# Altium integrated library RL2.IntLib: 663 symbols (part 3 of 4) (continued)
## ATSAME70Q19A-CN (continued)
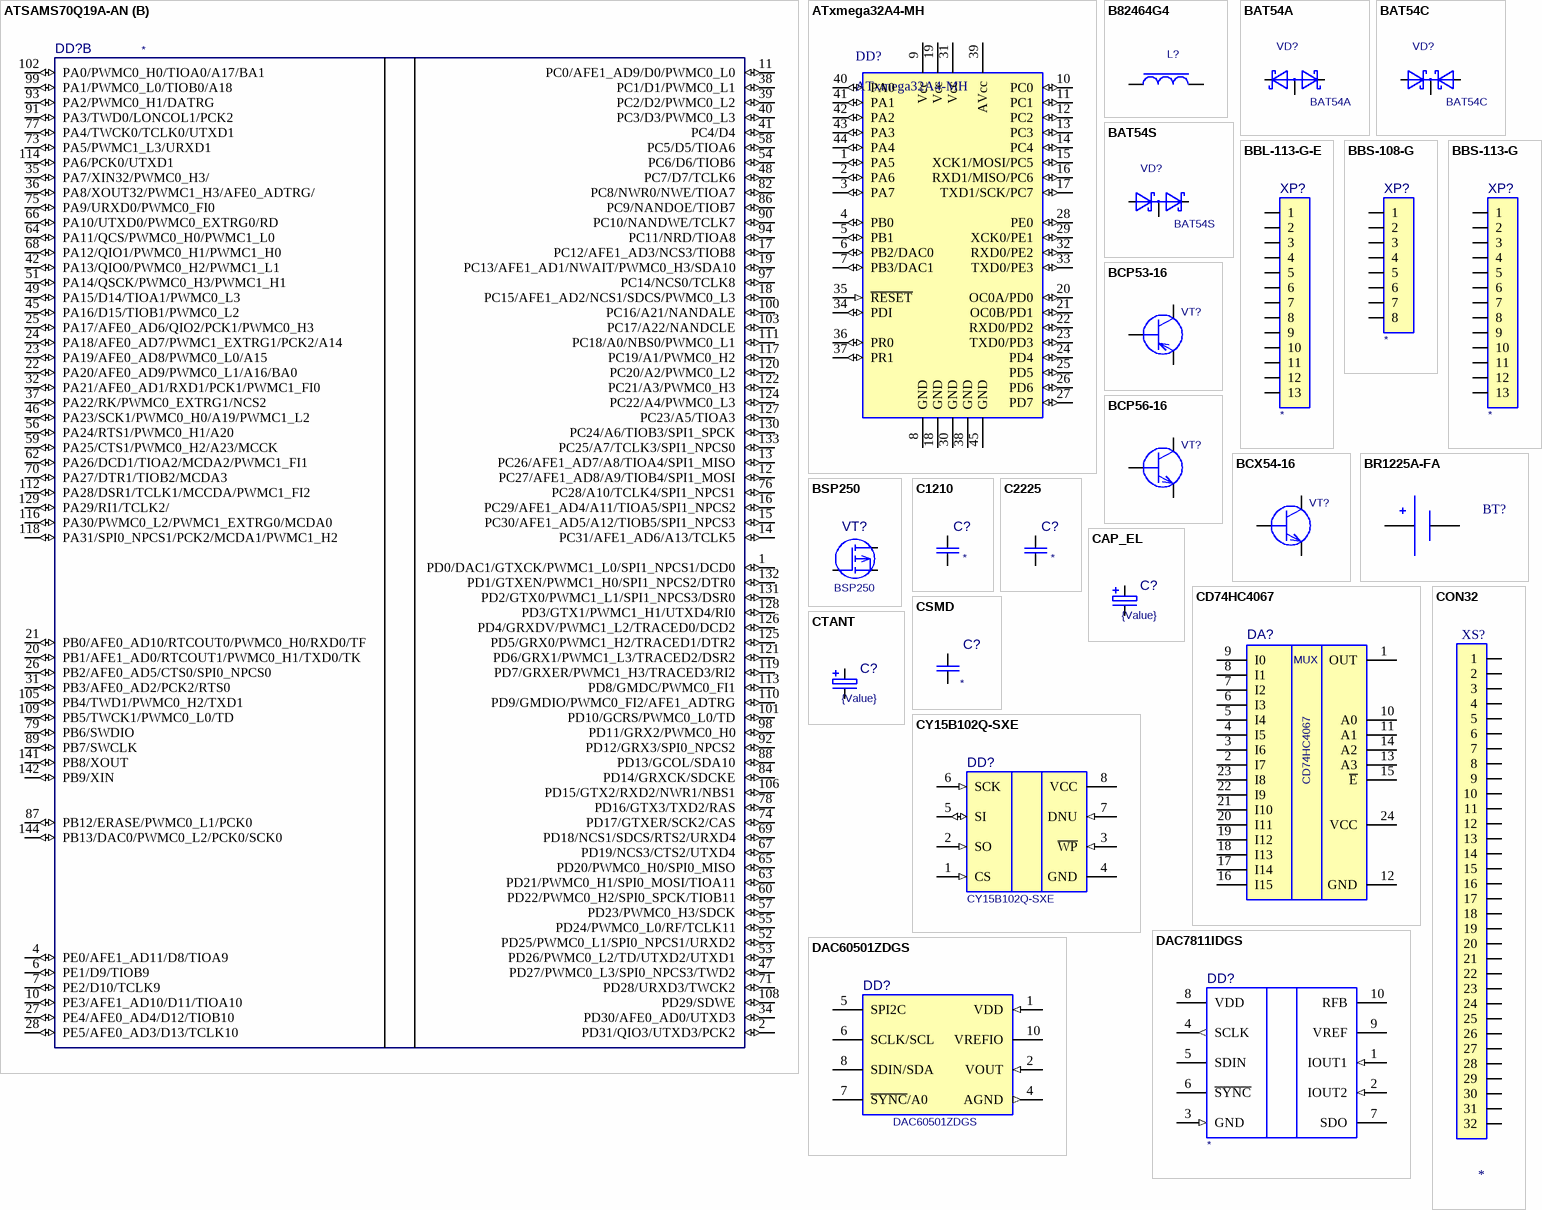
[diagram p26: symbols ATSAMS70Q19A-AN to DAC60501ZDGS]

## ATSAMS70Q19A-AN
designator DD?
footprint LQFP144
part A pins: 3 VDDOUT (power), 5 VDDIN (power), 8 VREFN (power), 9 VREFP (power), 29 VDDCORE (power), 30 VDDIO (power), 33 VDDCORE (power), 43 VDDIO (power), 44 GND (power), 50 VDDCORE (power), 61 GND (power), 72 VDDIO (power), 80 VDDIO (power), 81 VDDCORE (power), 83 NRST (in), 85 TEST (in), 95 GND (power), 96 VDDIO (power), 104 JTAGSEL (in), 107 VDDCORE (power), 115 GND (power), 123 VDDPLL (power), 134 VDDUTMII (power), 135 GND (power), 136 HSDM (io), 137 HSDP (io), 138 GND (power), 139 VDDUTMIC (power), 140 VBG (in), 143 VDDPLLUSB (power)
part B pins: 1 PD0/DAC1/GTXCK/PWMC1_L0/SPI1_NPCS1/DCD0 (io), 2 PD31/QIO3/UTXD3/PCK2 (io), 4 PE0/AFE1_AD11/D8/TIOA9 (io), 6 PE1/D9/TIOB9 (io), 7 PE2/D10/TCLK9 (io), 10 PE3/AFE1_AD10/D11/TIOA10 (io), 11 PC0/AFE1_AD9/D0/PWMC0_L0 (io), 12 PC27/AFE1_AD8/A9/TIOB4/SPI1_MOSI (io), 13 PC26/AFE1_AD7/A8/TIOA4/SPI1_MISO (io), 14 PC31/AFE1_AD6/A13/TCLK5 (io), 15 PC30/AFE1_AD5/A12/TIOB5/SPI1_NPCS3 (io), 16 PC29/AFE1_AD4/A11/TIOA5/SPI1_NPCS2 (io), 17 PC12/AFE1_AD3/NCS3/TIOB8 (io), 18 PC15/AFE1_AD2/NCS1/SDCS/PWMC0_L3 (io), 19 PC13/AFE1_AD1/NWAIT/PWMC0_H3/SDA10 (io), 20 PB1/AFE1_AD0/RTCOUT1/PWMC0_H1/TXD0/TK (io), 21 PB0/AFE0_AD10/RTCOUT0/PWMC0_H0/RXD0/TF (io), 22 PA20/AFE0_AD9/PWMC0_L1/A16/BA0 (io), 23 PA19/AFE0_AD8/PWMC0_L0/A15 (io), 24 PA18/AFE0_AD7/PWMC1_EXTRG1/PCK2/A14 (io), 25 PA17/AFE0_AD6/QIO2/PCK1/PWMC0_H3 (io), 26 PB2/AFE0_AD5/CTS0/SPI0_NPCS0 (io), 27 PE4/AFE0_AD4/D12/TIOB10 (io), 28 PE5/AFE0_AD3/D13/TCLK10 (io), 31 PB3/AFE0_AD2/PCK2/RTS0 (io), 32 PA21/AFE0_AD1/RXD1/PCK1/PWMC1_FI0 (io), 34 PD30/AFE0_AD0/UTXD3 (io), 35 PA7/XIN32/PWMC0_H3/ (io), 36 PA8/XOUT32/PWMC1_H3/AFE0_ADTRG/ (io), 37 PA22/RK/PWMC0_EXTRG1/NCS2 (io), 38 PC1/D1/PWMC0_L1 (io), 39 PC2/D2/PWMC0_L2 (io), 40 PC3/D3/PWMC0_L3 (io), 41 PC4/D4 (io), 42 PA13/QIO0/PWMC0_H2/PWMC1_L1 (io), 45 PA16/D15/TIOB1/PWMC0_L2 (io), 46 PA23/SCK1/PWMC0_H0/A19/PWMC1_L2 (io), 47 PD27/PWMC0_L3/SPI0_NPCS3/TWD2 (io), 48 PC7/D7/TCLK6 (io), 49 PA15/D14/TIOA1/PWMC0_L3 (io), 51 PA14/QSCK/PWMC0_H3/PWMC1_H1 (io), 52 PD25/PWMC0_L1/SPI0_NPCS1/URXD2 (io), 53 PD26/PWMC0_L2/TD/UTXD2/UTXD1 (io), 54 PC6/D6/TIOB6 (io), 55 PD24/PWMC0_L0/RF/TCLK11 (io), 56 PA24/RTS1/PWMC0_H1/A20 (io), 57 PD23/PWMC0_H3/SDCK (io), 58 PC5/D5/TIOA6 (io), 59 PA25/CTS1/PWMC0_H2/A23/MCCK (io), 60 PD22/PWMC0_H2/SPI0_SPCK/TIOB11 (io), 62 PA26/DCD1/TIOA2/MCDA2/PWMC1_FI1 (io), 63 PD21/PWMC0_H1/SPI0_MOSI/TIOA11 (io), 64 PA11/QCS/PWMC0_H0/PWMC1_L0 (io), 65 PD20/PWMC0_H0/SPI0_MISO (io), 66 PA10/UTXD0/PWMC0_EXTRG0/RD (io), 67 PD19/NCS3/CTS2/UTXD4 (io), 68 PA12/QIO1/PWMC0_H1/PWMC1_H0 (io), 69 PD18/NCS1/SDCS/RTS2/URXD4 (io), 70 PA27/DTR1/TIOB2/MCDA3 (io), 71 PD28/URXD3/TWCK2 (io), 73 PA5/PWMC1_L3/URXD1 (io), 74 PD17/GTXER/SCK2/CAS (io), 75 PA9/URXD0/PWMC0_FI0 (io), 76 PC28/A10/TCLK4/SPI1_NPCS1 (io), 77 PA4/TWCK0/TCLK0/UTXD1 (io), 78 PD16/GTX3/TXD2/RAS (io), 79 PB6/SWDIO (io), 82 PC8/NWR0/NWE/TIOA7 (io), 84 PD14/GRXCK/SDCKE (io), 86 PC9/NANDOE/TIOB7 (io), 87 PB12/ERASE/PWMC0_L1/PCK0 (io), 88 PD13/GCOL/SDA10 (io), 89 PB7/SWCLK (io), 90 PC10/NANDWE/TCLK7 (io), 91 PA3/TWD0/LONCOL1/PCK2 (io), 92 PD12/GRX3/SPI0_NPCS2 (io), 93 PA2/PWMC0_H1/DATRG (io), 94 PC11/NRD/TIOA8 (io), 97 PC14/NCS0/TCLK8 (io), 98 PD11/GRX2/PWMC0_H0 (io), 99 PA1/PWMC0_L0/TIOB0/A18 (io), 100 PC16/A21/NANDALE (io), 101 PD10/GCRS/PWMC0_L0/TD (io), 102 PA0/PWMC0_H0/TIOA0/A17/BA1 (io), 103 PC17/A22/NANDCLE (io), 105 PB4/TWD1/PWMC0_H2/TXD1 (io), 106 PD15/GTX2/RXD2/NWR1/NBS1 (io), 108 PD29/SDWE (io), 109 PB5/TWCK1/PWMC0_L0/TD (io), 110 PD9/GMDIO/PWMC0_FI2/AFE1_ADTRG (io), 111 PC18/A0/NBS0/PWMC0_L1 (io), 112 PA28/DSR1/TCLK1/MCCDA/PWMC1_FI2 (io), 113 PD8/GMDC/PWMC0_FI1 (io), 114 PA6/PCK0/UTXD1 (io), 116 PA30/PWMC0_L2/PWMC1_EXTRG0/MCDA0 (io), 117 PC19/A1/PWMC0_H2 (io), 118 PA31/SPI0_NPCS1/PCK2/MCDA1/PWMC1_H2 (io), 119 PD7/GRXER/PWMC1_H3/TRACED3/RI2 (io), 120 PC20/A2/PWMC0_L2 (io), 121 PD6/GRX1/PWMC1_L3/TRACED2/DSR2 (io), 122 PC21/A3/PWMC0_H3 (io), 124 PC22/A4/PWMC0_L3 (io), 125 PD5/GRX0/PWMC1_H2/TRACED1/DTR2 (io), 126 PD4/GRXDV/PWMC1_L2/TRACED0/DCD2 (io), 127 PC23/A5/TIOA3 (io), 128 PD3/GTX1/PWMC1_H1/UTXD4/RI0 (io), 129 PA29/RI1/TCLK2/ (io), 130 PC24/A6/TIOB3/SPI1_SPCK (io), 131 PD2/GTX0/PWMC1_L1/SPI1_NPCS3/DSR0 (io), 132 PD1/GTXEN/PWMC1_H0/SPI1_NPCS2/DTR0 (io), 133 PC25/A7/TCLK3/SPI1_NPCS0 (io), 141 PB8/XOUT (io), 142 PB9/XIN (io), 144 PB13/DAC0/PWMC0_L2/PCK0/SCK0 (io)

## ATxmega32A4-MH
designator DD?
XMEGA processor
footprint VQFN44M1
pins: 1 PA5 (io), 2 PA6 (io), 3 PA7 (io), 4 PB0 (io), 5 PB1 (io), 6 PB2/DAC0 (io), 7 PB3/DAC1 (io), 8 GND (power), 9 Vcc (power), 10 PC0 (io), 11 PC1 (io), 12 PC2 (io), 13 PC3 (io), 14 PC4 (io), 15 XCK1/MOSI/PC5 (io), 16 RXD1/MISO/PC6 (io), 17 TXD1/SCK/PC7 (io), 18 GND (power), 19 Vcc (power), 20 OC0A/PD0 (io), 21 OC0B/PD1 (io), 22 RXD0/PD2 (io), 23 TXD0/PD3 (io), 24 PD4 (io), 25 PD5 (io), 26 PD6 (io), 27 PD7 (io), 28 PE0 (io), 29 XCK0/PE1 (io), 30 GND (power), 31 Vcc (power), 32 RXD0/PE2 (io), 33 TXD0/PE3 (io), 34 PDI (io), 35 ~{RESET} (in), 36 PR0 (io), 37 PR1 (io), 38 GND (power), 39 AVcc (power), 40 PA0 (io), 41 PA1 (io), 42 PA2 (io), 43 PA3 (io), 44 PA4 (io), 45 GND (power)

## B82464G4
designator L?  (value not drawn)
SMT power inductors; Value: *
footprint B82464G4 (SM Inductor; 2 Leads; Size 10x10 mm)
pins: 1, 2

## BAT54A
designator VD?
30V, 200mA, Schottky Diodes; Value: *
footprint SOT-23
pins: 1 A, 2 K, 3 C

## BAT54C
designator VD?
30V, 200mA, Schottky Diodes; Value: *
footprint SOT-23
pins: 1 A, 2 K, 3 C

## BAT54S
designator VD?
30V, 200mA, Schottky Diodes; Value: *
footprint SOT-23
pins: 1 A, 2 K, 3 C

## BBL-113-G-E
designator XP?
Part Field 1: *; Part Field 2: *
footprint BBL-113-G-E
pins: 1, 2, 3, 4, 5, 6, 7, 8, 9, 10, 11, 12, 13

## BBS-108-G
designator XP?
Part Field 1: *; Part Field 2: *
footprint BBS-108-G-A
pins: 1, 2, 3, 4, 5, 6, 7, 8

## BBS-113-G
designator XP?
Part Field 1: *; Part Field 2: *
footprint BBS-113-G-B
footprint BBS-113-G-A
footprint BBS-113-G-C
pins: 1, 2, 3, 4, 5, 6, 7, 8, 9, 10, 11, 12, 13

## BCP53-16
designator VT?  (value not drawn)
80V, 1A PNP medium power transistors; Value: *
footprint SOT-223 PWR
pins: 1 B, 2 C, 3 E

## BCP56-16
designator VT?  (value not drawn)
80V, 1A NPN medium power transistors; Value: *
footprint SOT-223 PWR
pins: 1 B, 2 C, 3 E

## BCX54-16
designator VT?  (value not drawn)
45V, 1A NPN medium power transistor; Value: *
footprint SOT-89
pins: 1 B, 2 C, 3 E

## BR1225A-FA
designator BT?, comment Батарея BR1225A-FA  (value not drawn)
Part Field 1: *
pins: 1 + (power), 2 - (power)

## BSP250
designator VT?
Value: *
footprint SOT-223 PWR
pins: 1, 2, 3

## C1210
designator C?
C1210; Part Field 1: 1210; Value: *
footprint C1210
pins: 1, 2

## C2225
designator C?
C2225; Part Field 1: C2225; Value: *
footprint C2225
pins: 1, 2

## CAP_EL
designator C?  value {Value}  (hidden comment: *)
CAP_EL; Part Field 1: *; Part Field 2: *
footprint CAP_EL_16_32_HR
footprint CAP_EL_10_25_HR
footprint CAP_EL_10_20_HR
footprint CAP_EL_10_10_SMD
pins: 1, 2

## CD74HC4067
designator DA?
16-Channel Analog Multiplexer/Demultiplexer; Part Field 1: *; Part Field 2: *
footprint SSOP-24 (MO-150)
pins: 1 OUT, 2 I7, 3 I6, 4 I5, 5 I4, 6 I3, 7 I2, 8 I1, 9 I0, 10 A0, 11 A1, 12 GND, 13 A3, 14 A2, 15 ~{E}, 16 I15, 17 I14, 18 I13, 19 I12, 20 I11, 21 I10, 22 I9, 23 I8, 24 VCC
text: MUX

## CON32
designator XS?
Part Field 1: *; Part Field 2: *
pins: 1, 2, 3, 4, 5, 6, 7, 8, 9, 10, 11, 12, 13, 14, 15, 16, 17, 18, 19, 20, 21, 22, 23, 24, 25, 26, 27, 28, 29, 30, 31, 32

## CSMD
designator C?
C0603; Voltage: *; Part Field 1: *; Part Field 2: *; Value: *
footprint C0603
signal-integrity model capasitor (Model Description)
footprint C0805
footprint C0805L
footprint C0603L
pins: 1, 2

## CTANT
designator C?  value {Value}  (hidden comment: *)
CTANT; Part Field 1: *; Part Field 2: *
footprint C_A_POL_CTANT_A(Primary)
footprint C_D_POL
footprint C_B_POL
footprint C_C_POL
footprint C_R_POL
pins: N, P

## CY15B102Q-SXE
designator DD?
footprint SOIC8 EIAJ
signal-integrity model Model Name (Model Description)
pins: 1 CS (in), 2 SO (in), 3 ~{WP} (in), 4 GND (power), 5 SI (io), 6 SCK (in), 7 DNU (in), 8 VCC (power)

## DAC7811IDGS
designator DD?
footprint MSOP10 (MO-187-BA)
pins: 1 IOUT1 (in), 2 IOUT2 (in), 3 GND (in), 4 SCLK (out), 5 SDIN (power), 6 ~{SYNC} (power), 7 SDO (power), 8 VDD (power), 9 VREF (power), 10 RFB (power)

## DAC60501ZDGS
designator DD?
DACx0501 16-Bit, 14-Bit, and 12-Bit, 1-LSB INL, Voltage-Output DACs With Precision Internal Reference / • 16-bit performance: 1-LSB INL and DNL (max) / • Low glitch energy: 4 nV–s / • Wide power supply: 2.7 V to 5.5 V / • Buffered output range: 5 V, 2.5 V, or 1.25 V / • Very-low power: 1 mA at 5.5 V / • Integrated 5-ppm/˚C (max), 2.5-V precision / reference / • Pin-selectable serial interface: / – 3-wire, SPI compatible up to 50-MHz / – 2-wire, I2C compatible / • Power-on-reset: Zero scale or midscale / • 1.62-V VIH with VDD = 5.5 V / • Temperature range: –40˚C to +125˚C
footprint MSOP10 (MO-187-BA)
pins: 1 VDD (in), 2 VOUT (in), 4 AGND (out), 5 SPI2C (power), 6 SCLK/SCL (power), 7 ~{SYNC}/A0 (power), 8 SDIN/SDA (power), 10 VREFIO (power)

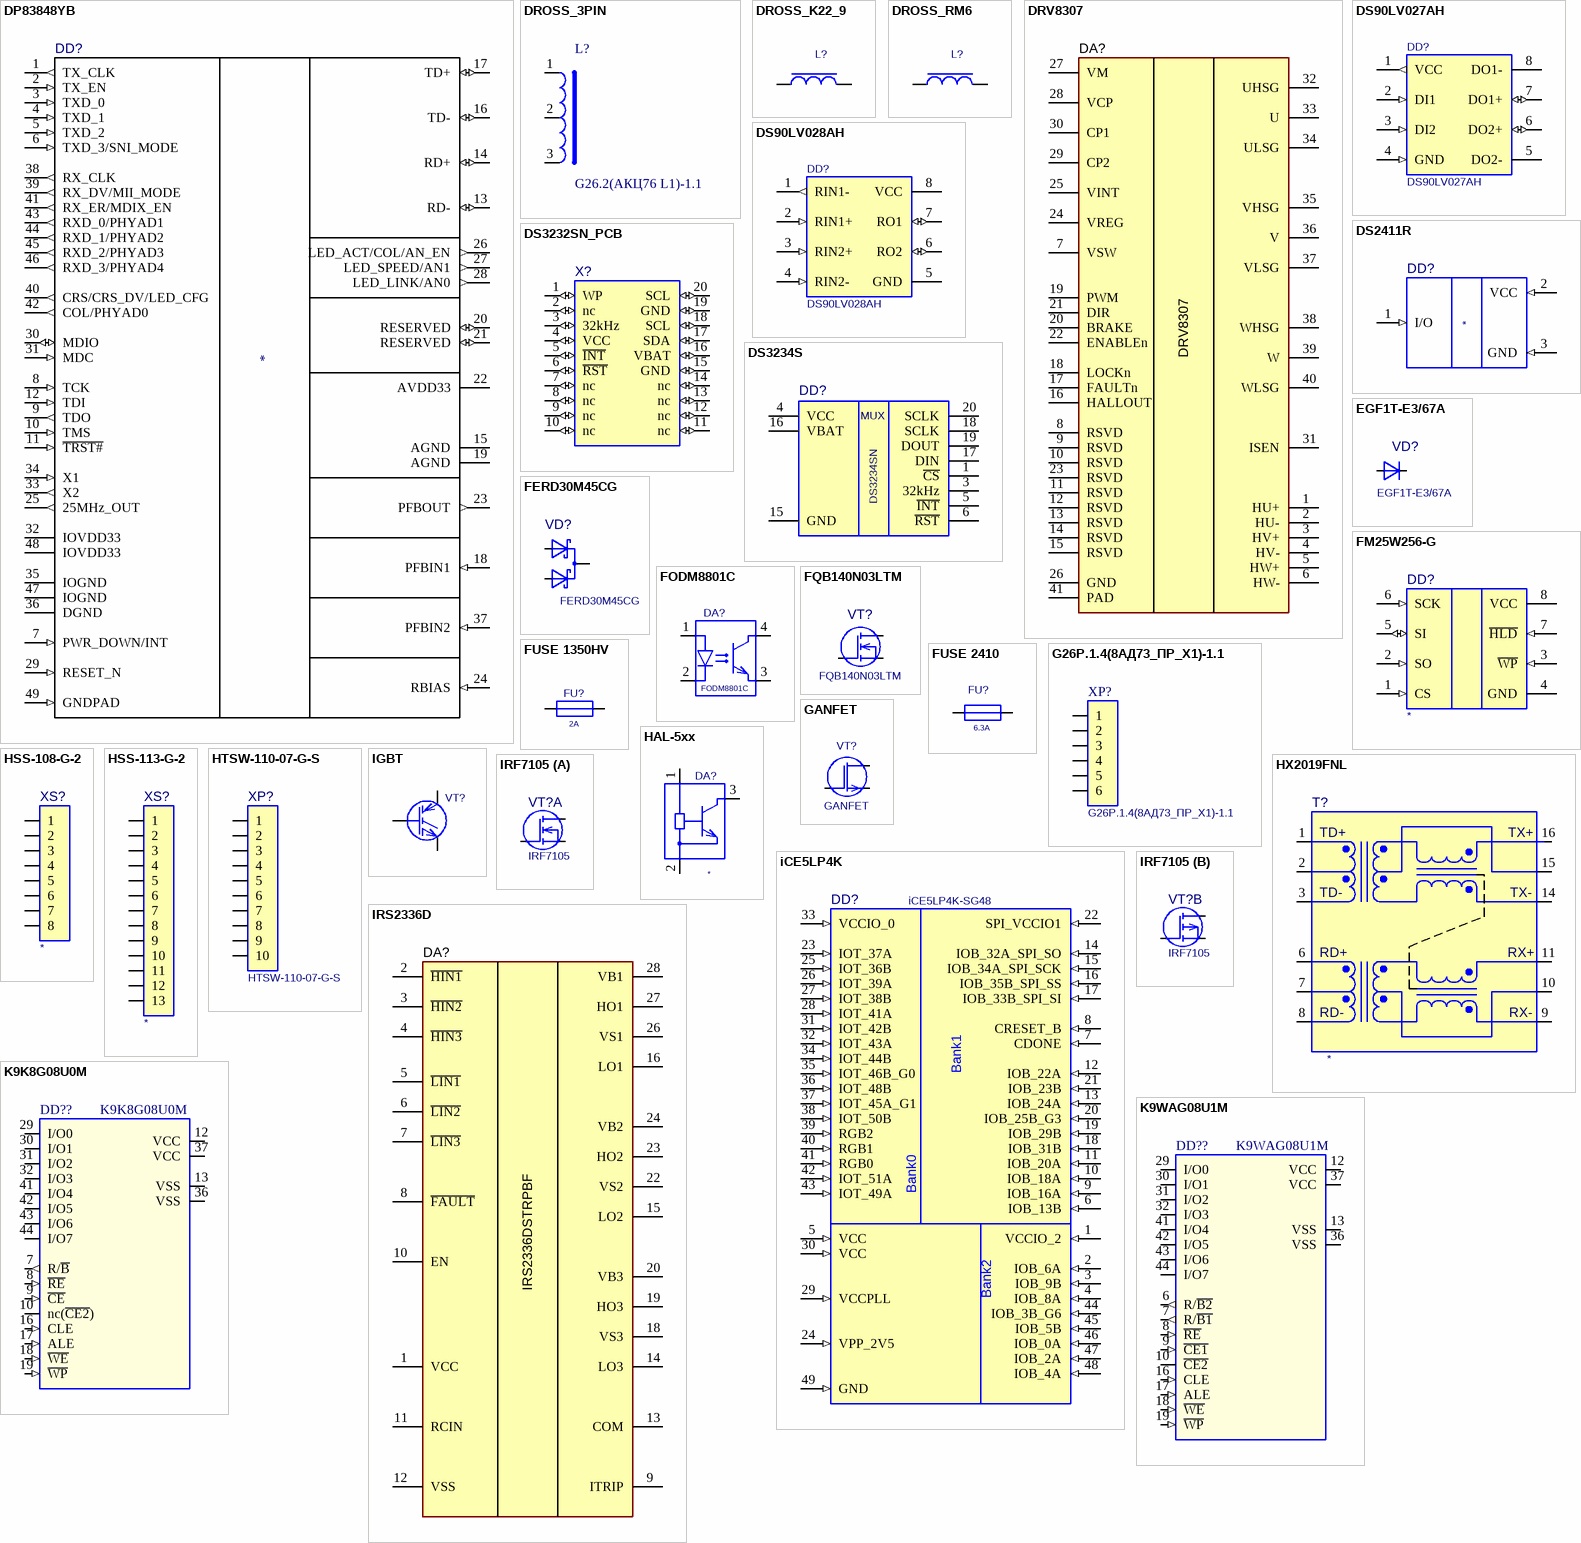
[diagram p27: symbols DP83848YB to K9WAG08U1M]

## DP83848YB
designator DD?
footprint LQFP48_VXH48A
signal-integrity model DP83848YB (DP83848YB IBIS)
pins: 1 TX_CLK (out), 2 TX_EN (in), 3 TXD_0 (in), 4 TXD_1 (in), 5 TXD_2 (in), 6 TXD_3/SNI_MODE (in), 7 PWR_DOWN/INT (in), 8 TCK (in), 9 TDO (out), 10 TMS (in), 11 ~{TRST#} (in), 12 TDI (in), 13 RD- (io), 14 RD+ (io), 15 AGND (power), 16 TD- (io), 17 TD+ (io), 18 PFBIN1 (in), 19 AGND (power), 20 RESERVED (io), 21 RESERVED (io), 22 AVDD33 (power), 23 PFBOUT (out), 24 RBIAS (in), 25 25MHz_OUT (out), 26 LED_ACT/COL/AN_EN (out), 27 LED_SPEED/AN1 (out), 28 LED_LINK/AN0 (out), 29 RESET_N (in), 30 MDIO (io), 31 MDC (in), 32 IOVDD33 (power), 33 X2 (out), 34 X1 (in), 35 IOGND (power), 36 DGND (power), 37 PFBIN2 (in), 38 RX_CLK (out), 39 RX_DV/MII_MODE (out), 40 CRS/CRS_DV/LED_CFG (out), 41 RX_ER/MDIX_EN (out), 42 COL/PHYAD0 (out), 43 RXD_0/PHYAD1 (out), 44 RXD_1/PHYAD2 (out), 45 RXD_2/PHYAD3 (out), 46 RXD_3/PHYAD4 (out), 47 IOGND (power), 48 IOVDD33 (power), 49 GNDPAD (in)

## DROSS_3PIN
designator L?, comment G26.2(АКЦ76 L1)-1.1
Part Field 1: *; Part Field 2: *
footprint K24-3 (Дроссель)
pins: 1, 2, 3

## DROSS_K22_9
designator L?  (value not drawn)
B82464G4; Value: *
footprint K22-9-2 (Дроссель)
pins: 1, 2

## DROSS_RM6
designator L?  (value not drawn)
B82464G4; Value: *
footprint RM6-6_E-045-1 (RM Cores B65807)
pins: 2, 6

## DRV8307
designator DA?
Manufacturer: Texas Instruments; MFG Part Number: DRV8307RHAT; Digikey Part#: N/A; Value: N/A
footprint VQFN40 (QFN, 40-Leads, Body 6x6mm, Pitch 0.5mm, Thermal Pad 2.9x2.9mm, TI Recommended)
pins: 1 HU+, 2 HU-, 3 HV+, 4 HV-, 5 HW+, 6 HW-, 7 VSW, 8 RSVD, 9 RSVD, 10 RSVD, 11 RSVD, 12 RSVD, 13 RSVD, 14 RSVD, 15 RSVD, 16 HALLOUT, 17 FAULTn, 18 LOCKn, 19 PWM, 20 BRAKE, 21 DIR, 22 ENABLEn, 23 RSVD, 24 VREG, 25 VINT, 26 GND, 27 VM, 28 VCP, 29 CP2, 30 CP1, 31 ISEN, 32 UHSG, 33 U, 34 ULSG, 35 VHSG, 36 V, 37 VLSG, 38 WHSG, 39 W, 40 WLSG, 41 PAD

## DS90LV027AH
designator DD?
DS90LV027AH high temperature LVDS dual differential driver; Value: *
footprint SOIC8 JEDEC
pins: 1 VCC (out), 2 DI1 (in), 3 DI2 (in), 4 GND (in), 5 DO2- (power), 6 DO2+ (io), 7 DO1+ (io), 8 DO1- (power)

## DS90LV028AH
designator DD?
DS90LV028AH high temperature3-V LVDS dual differentialline receiver; Value: *
footprint SOIC8 JEDEC
pins: 1 RIN1- (out), 2 RIN1+ (in), 3 RIN2+ (in), 4 RIN2- (in), 5 GND (power), 6 RO2 (io), 7 RO1 (io), 8 VCC (power)

## DS2411R
designator DD?
footprint SOT-23
pins: 1 I/O (in), 2 VCC (in), 3 GND (in)

## DS3232SN_PCB
designator X?
footprint DS3232SN_PCB
pins: 1 WP (io), 2 nc (io), 3 32kHz (io), 4 VCC (io), 5 ~{INT} (io), 6 ~{RST} (io), 7 nc (io), 8 nc (io), 9 nc (io), 10 nc (io), 11 nc (io), 12 nc (io), 13 nc (io), 14 nc (io), 15 GND (io), 16 VBAT (io), 17 SDA (io), 18 SCL (io), 19 GND (io), 20 SCL (io)

## DS3234S
designator DD?, comment DS3234SN
Part Field 1: *; Part Field 2: *
footprint SOIC-20 (JEDEC MS-013-AC)
pins: 1 ~{CS}, 3 32kHz, 4 VCC, 5 ~{INT}, 6 ~{RST}, 15 GND, 16 VBAT, 17 DIN, 18 SCLK, 19 DOUT, 20 SCLK
text: MUX

## EGF1T-E3/67A
designator VD?
Value: *
footprint DO-214BA GF1
pins: 1, 2

## FERD30M45CG
designator VD?
Value: *
footprint D2PAK TO-263-2
pins: 1 A1, 2 A2, 3 K

## FM25W256-G
designator DD?
footprint SOIC8 JEDEC
signal-integrity model Model Name (Model Description)
pins: 1 CS (in), 2 SO (in), 3 ~{WP} (in), 4 GND (power), 5 SI (io), 6 SCK (in), 7 ~{HLD} (in), 8 VCC (power)

## FODM8801C
designator DA?
Value: *
footprint Mini-Flat-4
pins: 1, 2, 3, 4

## FQB140N03LTM
designator VT?
Value: *
footprint D2PAK TO-263-2
pins: 1, 2, 3

## FUSE 1350HV
designator FU?, comment value 2A  (hidden comment: TR-1350HV2-R)
High voltage fast-acting brick fuse
footprint FUSE 1350HV
pins: 1, 2

## FUSE 2410
designator FU?, comment value 6.3A  (hidden comment: 0679L6300-05)
MF-MSMF160
footprint FUSE2410
pins: 1, 2

## G26P.1.4(8АД73_ПР_Х1)-1.1
designator XP?
Part Field 1: *; Part Field 2: *
footprint G26P.1.4(8АД73_ПР_Х1)-1.1
pins: 1, 2, 3, 4, 5, 6

## GANFET
designator VT?
Gallium Nitride (GaN) FET; OriginalName: 2N4124; ComponentField6: Published 8-Jun-2000, Modified 11-July-2000: SIM Model Added.; Value: *
footprint TO-247H-GAN-BOTTOM
pins: 1 G, 2 S, 3 D

## HAL-5xx
designator DA?
Hall Effect Sensor; Value: *
footprint HAL-5xx (TO-92UA)
pins: 1, 2, 3

## HSS-108-G-2
designator XS?
HSS-108-G-2; Part Field 1: *; Part Field 2: *
footprint HSS-108-G-2 h4.4
pins: 1, 2, 3, 4, 5, 6, 7, 8

## HSS-113-G-2
designator XS?
Part Field 1: *; Part Field 2: *
footprint HSS-113-G-2 h4.4
footprint HSS-113-G-2 h2.54
pins: 1, 2, 3, 4, 5, 6, 7, 8, 9, 10, 11, 12, 13

## HTSW-110-07-G-S
designator XP?
Part Field 1: *; Part Field 2: *
footprint HTSW-110-07-G-S
pins: 1, 2, 3, 4, 5, 6, 7, 8, 9, 10

## HX2019FNL
designator T?
footprint HX2019FNL
pins: 1 TD+, 2, 3, 6, 7, 8, 9 5, 10 5, 11 5, 14, 15 EARTH, 16 EARTH
text: TX+; TD-; TX-; RD+; RX+; RD-; RX-

## iCE5LP4K
designator DD?, comment iCE5LP4K-SG48
footprint QFN48_5.8 (QFN, 64-Leads, Body 9x9mm, Pitch 0.5mm, Thermal Pad 7.3x7.3mm, IPC Low Density)
pins: 1 VCCIO_2 (in), 2 IOB_6A (in), 3 IOB_9B (in), 4 IOB_8A (in), 5 VCC (in), 6 IOB_13B (in), 7 CDONE (in), 8 CRESET_B (in), 9 IOB_16A (in), 10 IOB_18A (in), 11 IOB_20A (in), 12 IOB_22A (in), 13 IOB_24A (in), 14 IOB_32A_SPI_SO (in), 15 IOB_34A_SPI_SCK (in), 16 IOB_35B_SPI_SS (in), 17 IOB_33B_SPI_SI (in), 18 IOB_31B (in), 19 IOB_29B (in), 20 IOB_25B_G3 (in), 21 IOB_23B (in), 22 SPI_VCCIO1 (in), 23 IOT_37A (in), 24 VPP_2V5 (in), 25 IOT_36B (in), 26 IOT_39A (in), 27 IOT_38B (in), 28 IOT_41A (in), 29 VCCPLL (in), 30 VCC (in), 31 IOT_42B (in), 32 IOT_43A (in), 33 VCCIO_0 (in), 34 IOT_44B (in), 35 IOT_46B_G0 (in), 36 IOT_48B (in), 37 IOT_45A_G1 (in), 38 IOT_50B (in), 39 RGB2 (in), 40 RGB1 (in), 41 RGB0 (in), 42 IOT_51A (in), 43 IOT_49A (in), 44 IOB_3B_G6 (in), 45 IOB_5B (in), 46 IOB_0A (in), 47 IOB_2A (in), 48 IOB_4A (in), 49 GND (in)
text: Bank1; Bank0; Bank2

## IGBT
designator VT?  (value not drawn)
STGD5NB120SZT4; Value: *
footprint D-PAK (TO-252)
footprint D2PAK TO-263-2
pins: 1 G, 2 E, 3 C

## IRF7105
designator VT?
footprint SOIC8 DBL FET
part A pins: 1, 2, 6
part B pins: 3, 4, 5

## IRS2336D
designator DA?, comment IRS2336DSTRPBF
Manufacturer: International Rectifier; Digikey Part#: N/A; MFG Part Number: IRS2336DSTRPBF; Value: N/A
footprint SOIC-28-300
pins: 1 VCC, 2 ~{HIN1}, 3 ~{HIN2}, 4 ~{HIN3}, 5 ~{LIN1}, 6 ~{LIN2}, 7 ~{LIN3}, 8 ~{FAULT}, 9 ITRIP, 10 EN, 11 RCIN, 12 VSS, 13 COM, 14 LO3, 15 LO2, 16 LO1, 18 VS3, 19 HO3, 20 VB3, 22 VS2, 23 HO2, 24 VB2, 26 VS1, 27 HO1, 28 VB1

## K9K8G08U0M
designator DD??
Part Field 1: *; Part Field 2: *
footprint TSSO12X20-G48/P.5
pins: 1 nc (power) hidden to GND, 2 nc (power) hidden to GND, 3 nc (power) hidden to GND, 4 nc (power) hidden to GND, 5 nc (power) hidden to GND, 6 nc (power) hidden to GND, 7 R/~{B} (out), 8 ~{RE} (in), 9 ~{CE} (in), 10 nc(~{CE2}), 11 nc (power) hidden to GND, 12 VCC (power), 13 VSS (power), 14 nc (power) hidden to GND, 15 nc (power) hidden to GND, 16 CLE (in), 17 ALE (in), 18 ~{WE} (in), 19 ~{WP} (in), 20 nc (power) hidden to GND, 21 nc (power) hidden to GND, 22 nc (power) hidden to GND, 23 nc (power) hidden to GND, 24 nc (power) hidden to GND, 25 nc (power) hidden to GND, 26 nc (power) hidden to GND, 27 nc (power) hidden to GND, 28 nc (power) hidden to GND, 29 I/O0 (io), 30 I/O1 (io), 31 I/O2 (io), 32 I/O3 (io), 33 nc (power) hidden to GND, 34 nc (power) hidden to GND, 35 nc (power) hidden to GND, 36 VSS (power), 37 VCC (power), 38 nc (power) hidden to GND, 39 nc (power) hidden to GND, 40 nc (power) hidden to GND, 41 I/O4 (io), 42 I/O5 (io), 43 I/O6 (io), 44 I/O7 (io), 45 nc (power) hidden to GND, 46 nc (power) hidden to GND, 47 nc (power) hidden to GND, 48 nc (power) hidden to GND

## K9WAG08U1M
designator DD??
Part Field 1: *; Part Field 2: *
footprint TSSO12X20-G48/P.5
pins: 1 nc (power) hidden to GND, 2 nc (power) hidden to GND, 3 nc (power) hidden to GND, 4 nc (power) hidden to GND, 5 nc (power) hidden to GND, 6 R/~{B2} (out), 7 R/~{B1} (out), 8 ~{RE} (in), 9 ~{CE1} (in), 10 ~{CE2}, 11 nc (power) hidden to GND, 12 VCC (power), 13 VSS (power), 14 nc (power) hidden to GND, 15 nc (power) hidden to GND, 16 CLE (in), 17 ALE (in), 18 ~{WE} (in), 19 ~{WP} (in), 20 nc (power) hidden to GND, 21 nc (power) hidden to GND, 22 nc (power) hidden to GND, 23 nc (power) hidden to GND, 24 nc (power) hidden to GND, 25 nc (power) hidden to GND, 26 nc (power) hidden to GND, 27 nc (power) hidden to GND, 28 nc (power) hidden to GND, 29 I/O0 (io), 30 I/O1 (io), 31 I/O2 (io), 32 I/O3 (io), 33 nc (power) hidden to GND, 34 nc (power) hidden to GND, 35 nc (power) hidden to GND, 36 VSS (power), 37 VCC (power), 38 nc (power) hidden to GND, 39 nc (power) hidden to GND, 40 nc (power) hidden to GND, 41 I/O4 (io), 42 I/O5 (io), 43 I/O6 (io), 44 I/O7 (io), 45 nc (power) hidden to GND, 46 nc (power) hidden to GND, 47 nc (power) hidden to GND, 48 nc (power) hidden to GND

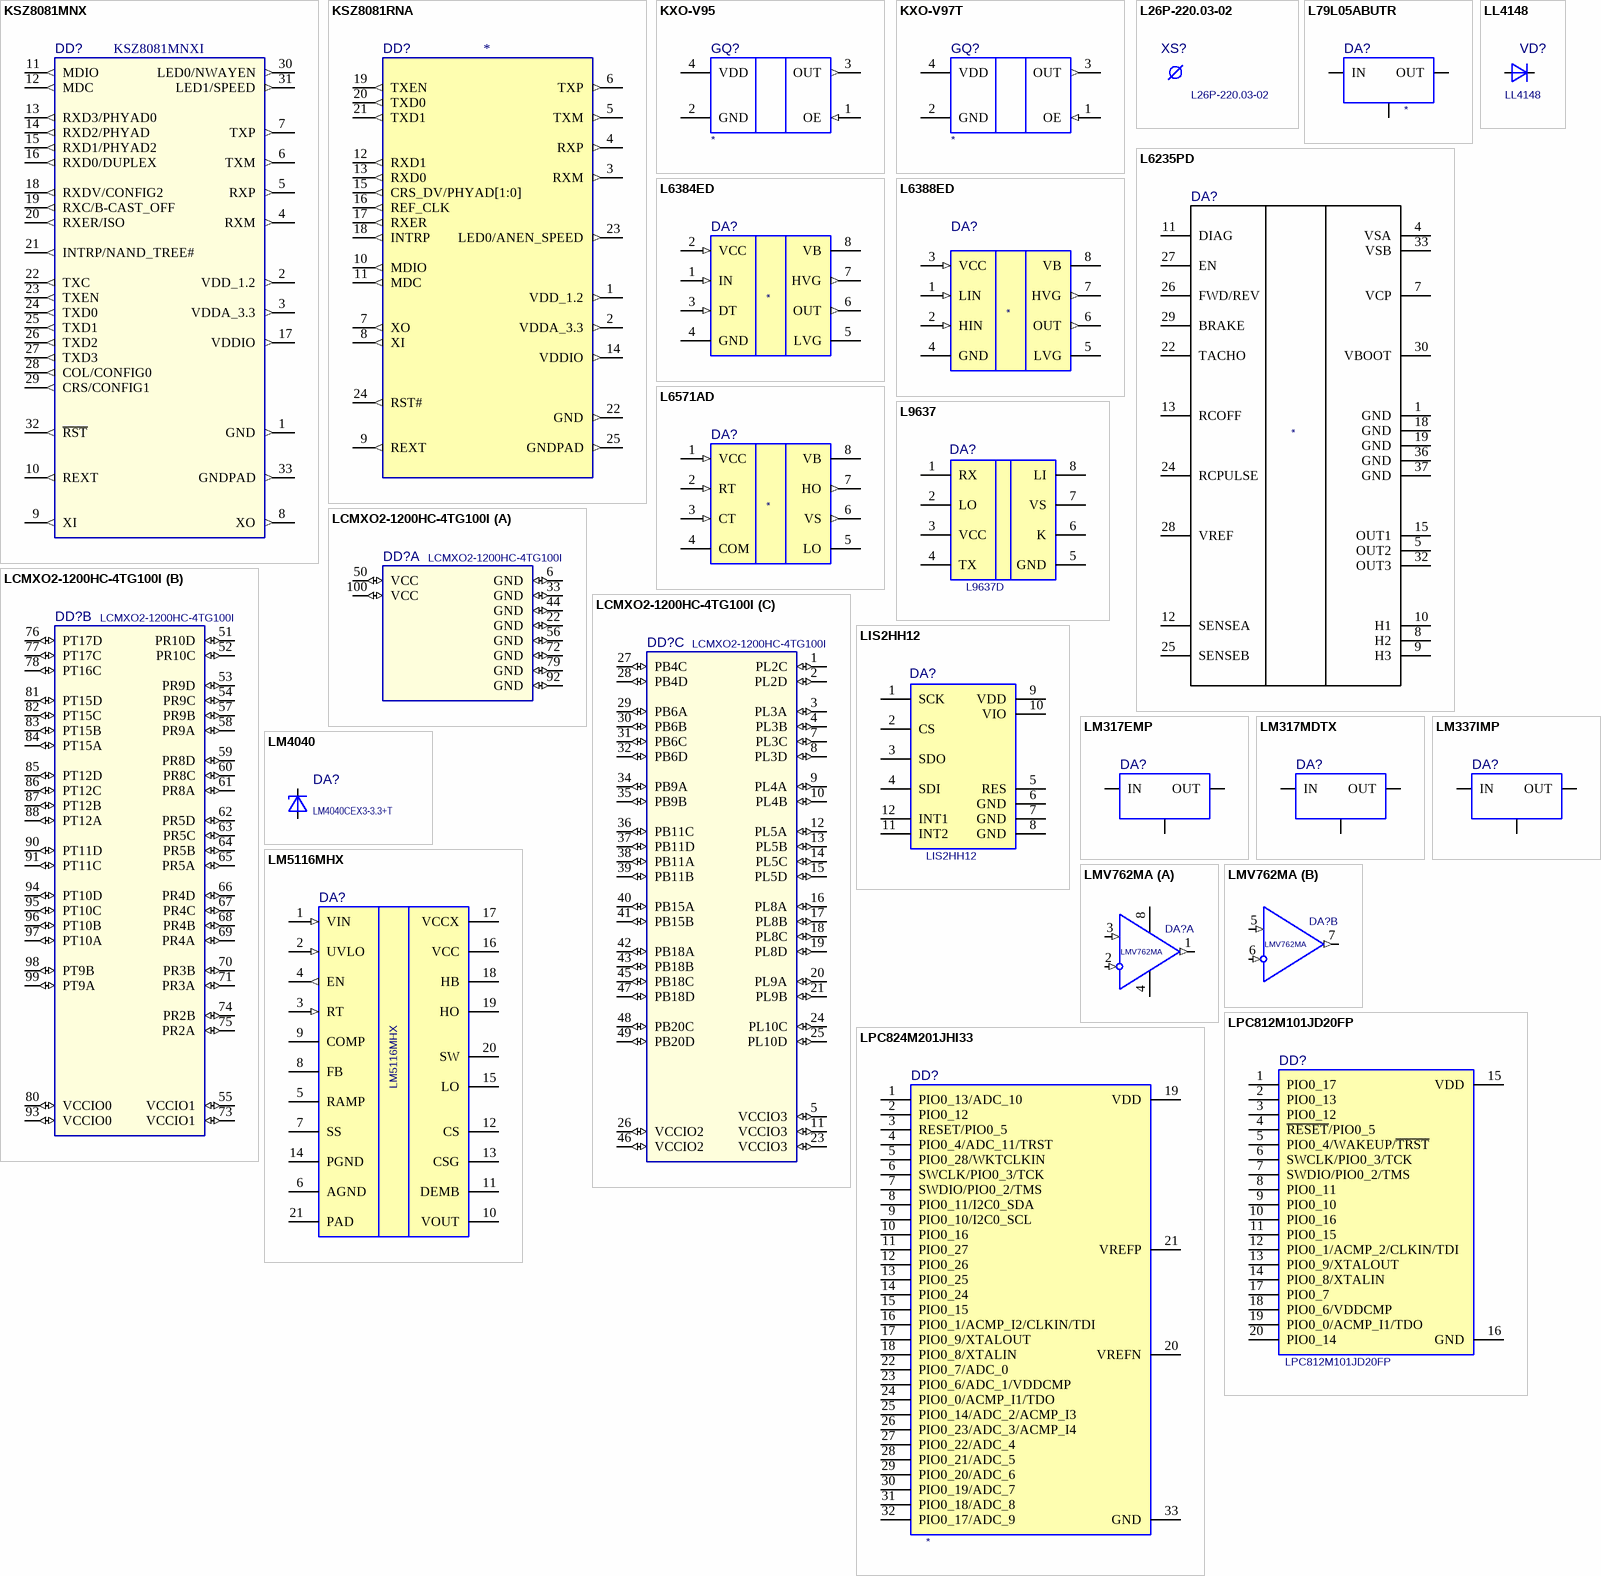
[diagram p28: symbols KSZ8081MNX to LPC824M201JHI33]

## KSZ8081MNX
designator DD?, comment KSZ8081MNXI
footprint HVQFN33
pins: 1 GND (out), 2 VDD_1.2 (out), 3 VDDA_3.3 (out), 4 RXM (out), 5 RXP (out), 6 TXM (out), 7 TXP (out), 8 XO (out), 9 XI (out), 10 REXT (out), 11 MDIO (out), 12 MDC (out), 13 RXD3/PHYAD0 (out), 14 RXD2/PHYAD (out), 15 RXD1/PHYAD2 (out), 16 RXD0/DUPLEX (out), 17 VDDIO (out), 18 RXDV/CONFIG2 (out), 19 RXC/B-CAST_OFF (out), 20 RXER/ISO (out), 21 INTRP/NAND_TREE# (out), 22 TXC (out), 23 TXEN (out), 24 TXD0 (out), 25 TXD1 (out), 26 TXD2 (out), 27 TXD3 (out), 28 COL/CONFIG0 (out), 29 CRS/CONFIG1 (out), 30 LED0/NWAYEN (out), 31 LED1/SPEED (out), 32 ~{RST} (out), 33 GNDPAD (out)

## KSZ8081RNA
designator DD?
footprint QFN-24
pins: 1 VDD_1.2 (out), 2 VDDA_3.3 (out), 3 RXM (out), 4 RXP (out), 5 TXM (out), 6 TXP (out), 7 XO (out), 8 XI (out), 9 REXT (out), 10 MDIO (out), 11 MDC (out), 12 RXD1 (out), 13 RXD0 (out), 14 VDDIO (out), 15 CRS_DV/PHYAD[1:0] (out), 16 REF_CLK (out), 17 RXER (out), 18 INTRP (out), 19 TXEN (out), 20 TXD0 (out), 21 TXD1 (out), 22 GND (out), 23 LED0/ANEN_SPEED (out), 24 RST# (out), 25 GNDPAD (out)

## KXO-V95
designator GQ?
footprint KXO_2.5_2
pins: 1 OE (in), 2 GND (power), 3 OUT (out), 4 VDD (power)

## KXO-V97T
designator GQ?
footprint KXO-97
pins: 1 OE (in), 2 GND (power), 3 OUT (out), 4 VDD (power)

## L26P-220.03-02
designator XS?
footprint L26P-220.03-02
pins: 1

## L79L05ABUTR
designator DA?
footprint SOT-89
pins: 1 G, 2 IN, 3 OUT

## L6235PD
designator DA?
footprint POWERSO36
pins: 1 GND, 4 VSA, 5 OUT2, 7 VCP, 8 H2, 9 H3, 10 H1, 11 DIAG, 12 SENSEA, 13 RCOFF, 15 OUT1, 18 GND, 19 GND, 22 TACHO, 24 RCPULSE, 25 SENSEB, 26 FWD/REV, 27 EN, 28 VREF, 29 BRAKE, 30 VBOOT, 32 OUT3, 33 VSB, 36 GND, 37 GND

## L6384ED
designator DA?
footprint SOIC8 JEDEC
pins: 1 IN (in), 2 VCC (in), 3 DT (in), 4 GND (power), 5 LVG (power), 6 OUT (out), 7 HVG (out), 8 VB (power)

## L6388ED
designator DA?
footprint SOIC8 JEDEC
pins: 1 LIN (in), 2 HIN (in), 3 VCC (in), 4 GND (power), 5 LVG (power), 6 OUT (out), 7 HVG (out), 8 VB (power)

## L6571AD
designator DA?
footprint SOIC8 JEDEC
pins: 1 VCC (in), 2 RT (in), 3 CT (in), 4 COM (power), 5 LO (power), 6 VS (out), 7 HO (out), 8 VB (power)